# Altium footprint library SMDLibrary.PcbLib: 309 footprints (part 14 of 20)
Each footprint in its own frame and in the unit in brackets; x right, y up, seen from the top. Pads: shape width x height; smd on the part's side, far side on the other; paste and mask are expansions set on the pad; w line width, h text height; cw(c..) or ccw(c..) is an arc to the next point about the centre after c.
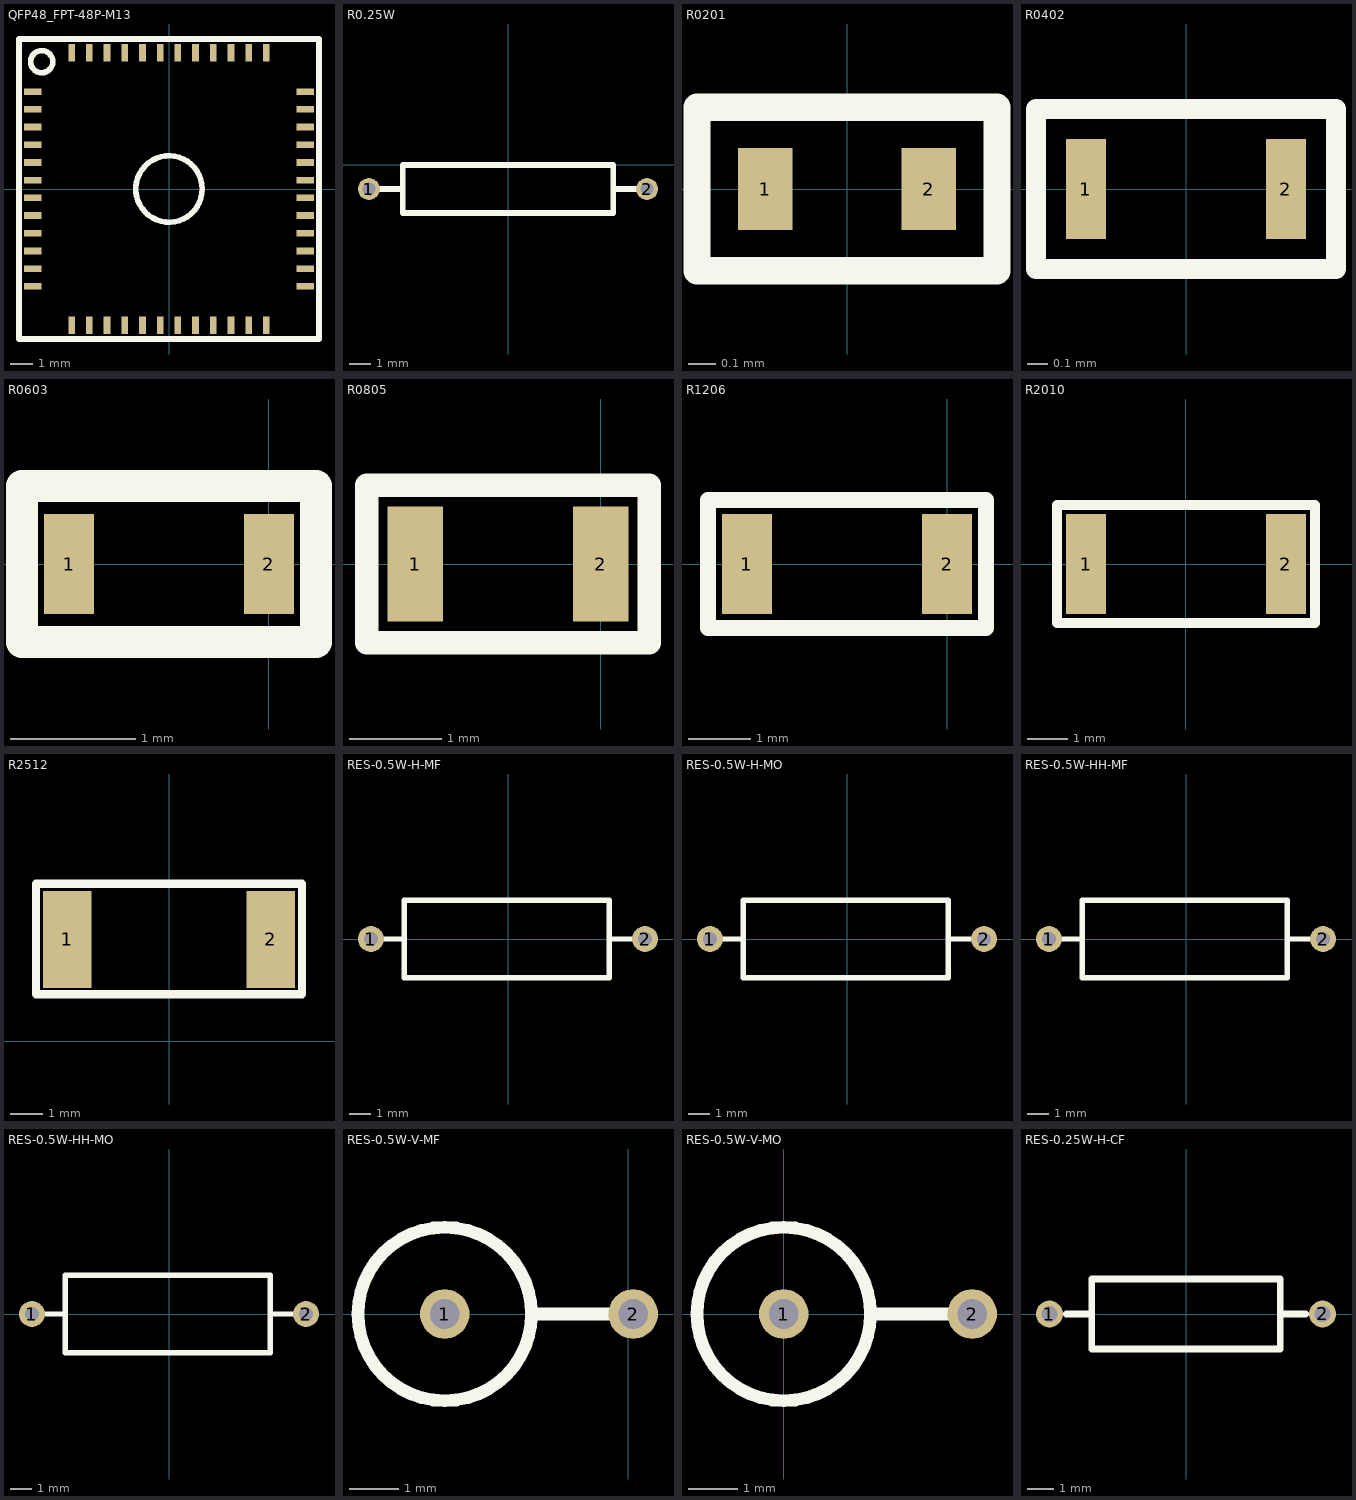
[diagram p13: the footprints below, top view; thin cyan lines are the x and y axes]

## QFP48_FPT-48P-M13 [mm]
pads (48):
  rect 0.8x0.3 smd: 1(-6.15,4.4) 2(-6.15,3.6) 3(-6.15,2.8) 4(-6.15,2) 5(-6.15,1.2) 6(-6.15,0.4) 7(-6.15,-0.4) 8(-6.15,-1.2) 9(-6.15,-2) 10(-6.15,-2.8) 11(-6.15,-3.6) 12(-6.15,-4.4) 25(6.15,-4.4) 26(6.15,-3.6) 27(6.15,-2.8) 28(6.15,-2) 29(6.15,-1.2) 30(6.15,-0.4) 31(6.15,0.4) 32(6.15,1.2) 33(6.15,2) 34(6.15,2.8) 35(6.15,3.6) 36(6.15,4.4)
  rect 0.3x0.8 smd: 13(-4.4,-6.15) 14(-3.6,-6.15) 15(-2.8,-6.15) 16(-2,-6.15) 17(-1.2,-6.15) 18(-0.4,-6.15) 19(0.4,-6.15) 20(1.2,-6.15) 21(2,-6.15) 22(2.8,-6.15) 23(3.6,-6.15) 24(4.4,-6.15) 37(4.4,6.15) 38(3.6,6.15) 39(2.8,6.15) 40(2,6.15) 41(1.2,6.15) 42(0.4,6.15) 43(-0.4,6.15) 44(-1.2,6.15) 45(-2,6.15) 46(-2.8,6.15) 47(-3.6,6.15) 48(-4.4,6.15)
Top Overlay:
  circle w0.254: c0,0 r1.5
  circle w0.254: c-5.75,5.75 r0.5
  lines w0.254: -6.775,-6.775 6.775,-6.775 6.775,6.775 -6.775,6.775 -6.775,-6.775
3D body "QFP48_FPT-48P-M13.stp": height 2.3, standoff 0, extent -6.55,-6.55 6.55,6.55

## R0.25W [mm]
pads (2):
  round 1 hole 0.6: 1(-6.35,-1.097) 2(6.35,-1.097)
Top Overlay:
  lines w0.254: -6.35,-1.096 -4.8,-1.096 ; 4.8,-1.096 6.35,-1.096 ; -4.8,-2.193 4.8,-2.193 4.8,0 -4.8,0 -4.8,-2.193
3D body "Widerstand.stp": height 3.1, standoff -2.5, extent -6.6,-2.193 6.6,0

## R0201 [mm]
pads (2):
  rect 0.2x0.3 smd: 1(-0.3,0) 2(0.3,0)
Top Overlay:
  lines w0.1: -0.55,-0.3 0.55,-0.3 0.55,0.3 -0.55,0.3 -0.55,-0.3
3D body "R0201.step": height 0.23, standoff 0, extent -0.3,-0.15 0.3,0.15

## R0402 [mm]
pads (2):
  rect 0.2x0.5 smd: 1(-0.5,0) 2(0.5,0)
Top Overlay:
  lines w0.1: -0.75,-0.4 0.75,-0.4 0.75,0.4 -0.75,0.4 -0.75,-0.4
3D body "R0402.step": height 0.32, standoff 0, extent -0.5,-0.25 0.5,0.25

## R0603 [mm]
pads (2):
  rect 0.4x0.8 smd: 1(-1.6,0) 2(0,0)
Top Overlay:
  lines w0.254: -1.975,-0.625 0.375,-0.625 0.375,0.625 -1.975,0.625 -1.975,-0.625
3D body "R0603.step": height 0.45, standoff 0, extent -1.6,-0.4 0,0.4

## R0805 [mm]
pads (2):
  rect 0.6x1.24 smd: 1(-2,0) 2(0,0)
Top Overlay:
  lines w0.254: -2.525,-0.85 -2.525,0.85 0.525,0.85 0.525,-0.85 -2.525,-0.85
3D body "User Library-RESC2012X05N.STEP": height 0.45, standoff 0, extent -2,-0.625 0,0.625

## R1206 [mm]
pads (2):
  rect 0.8x1.6 smd: 1(-3.2,0) 2(0,0)
Top Overlay:
  lines w0.254: -3.825,-1.025 -3.825,1.025 0.625,1.025 0.625,-1.025 -3.825,-1.025
3D body "R1206.step": height 0.55, standoff 0, extent -3.15,-0.8 -0.05,0.8

## R2010 [mm]
pads (2):
  rect 1x2.5 smd: 1(-2.5,0) 2(2.5,0)
Top Overlay:
  lines w0.254: -3.225,-1.473 -3.225,1.475 3.225,1.475 3.225,-1.473 -3.225,-1.473
3D body "SMD2010.STEP": height 0.56, standoff 0, extent -2.5,-1.25 2.5,1.25

## R2512 [mm]
pads (2):
  rect 1.5x3 smd: 1(-3.15,3.15) 2(3.15,3.15)
Top Overlay:
  lines w0.254: -4.125,1.45 -4.125,4.875 4.125,4.875 4.125,1.45 -4.125,1.45
3D body "SMD2512.STEP": height 0.59, standoff -0.01, extent -3.15,1.575 3.15,4.725

## RES-0.5W-H-MF [mm]
pads (2):
  round 1.2 hole 0.65: 1(-6.35,0) 2(6.35,0)
Top Overlay:
  lines w0.254: -5.7,0 -4.8,0 ; 4.7,0 5.7,0 ; -4.8,-1.8 -4.8,1.8 4.7,1.8 4.7,-1.8 -4.8,-1.8
3D body "RES-0.5W-H-MF.stp": height 3.7, standoff -2.5, extent -6.623,-1.8 6.625,1.8

## RES-0.5W-H-MO [mm]
pads (2):
  round 1.2 hole 0.65: 1(-6.35,0) 2(6.35,0)
Top Overlay:
  lines w0.254: -5.7,0 -4.8,0 ; 4.7,0 5.7,0 ; -4.8,-1.8 4.7,-1.8 4.7,1.8 -4.8,1.8 -4.8,-1.8
3D body "RES-0.5W-H-MO.stp": height 3.7, standoff -2.5, extent -6.623,-1.8 6.625,1.8

## RES-0.5W-HH-MF [mm]
pads (2):
  round 1.2 hole 0.65: 1(-6.35,0) 2(6.35,0)
Top Overlay:
  lines w0.254: -5.7,0 -4.8,0 ; 4.7,0 5.7,0 ; -4.8,-1.8 4.7,-1.8 4.7,1.8 -4.8,1.8 -4.8,-1.8
3D body "RES-0.5W-HH-MF.stp": height 3.9, standoff -4.7, extent -6.625,-1.8 6.625,1.8

## RES-0.5W-HH-MO [mm]
pads (2):
  round 1.2 hole 0.65: 1(-6.35,0) 2(6.35,0)
Top Overlay:
  lines w0.254: -5.7,0 -4.8,0 ; 4.7,0 5.7,0 ; -4.8,-1.8 -4.8,1.8 4.7,1.8 4.7,-1.8 -4.8,-1.8
3D body "RES-0.5W-HH-MO.stp": height 3.9, standoff -4.7, extent -6.625,-1.8 6.625,1.8

## RES-0.5W-V-MF [mm]
pads (2):
  round 1 hole 0.6: 1(-3.705,0) 2(0.1,0)
Top Overlay:
  circle w0.254: c-3.705,0 r1.751
  lines w0.254: -1.954,0 -0.4,0
3D body "RES-0.5W-V-MF.stp": height 12.56, standoff -2.5, extent -5.505,-1.8 0.378,1.8

## RES-0.5W-V-MO [mm]
pads (2):
  round 1 hole 0.6: 1(0,0) 2(3.805,0)
Top Overlay:
  circle w0.254: c0,0 r1.751
  lines w0.254: 1.751,0 3.305,0
3D body "RES-0.5W-V-MO.stp": height 12.56, standoff -2.5, extent -1.805,-1.8 4.078,1.8

## RES-0.25W-H-CF [mm]
pads (2):
  round 1 hole 0.6: 1(-5.075,0) 2(5.075,0)
Top Overlay:
  lines w0.254: -4.45,0 -3.5,0 ; 3.5,0 4.45,0 ; -3.5,-1.3 -3.5,1.3 3.5,1.3 3.5,-1.3 -3.5,-1.3
3D body "RES-0.25W-H-CF.stp": height 2.69, standoff -2.5, extent -5.353,-1.297 5.355,1.298